# Altium footprint library MyPcbLib.PcbLib: 657 footprints (part 4 of 42)
Each footprint in its own frame and in the unit in brackets; x right, y up, seen from the top. Pads: shape width x height; smd on the part's side, far side on the other; paste and mask are expansions set on the pad; w line width, h text height; cw(c..) or ccw(c..) is an arc to the next point about the centre after c.
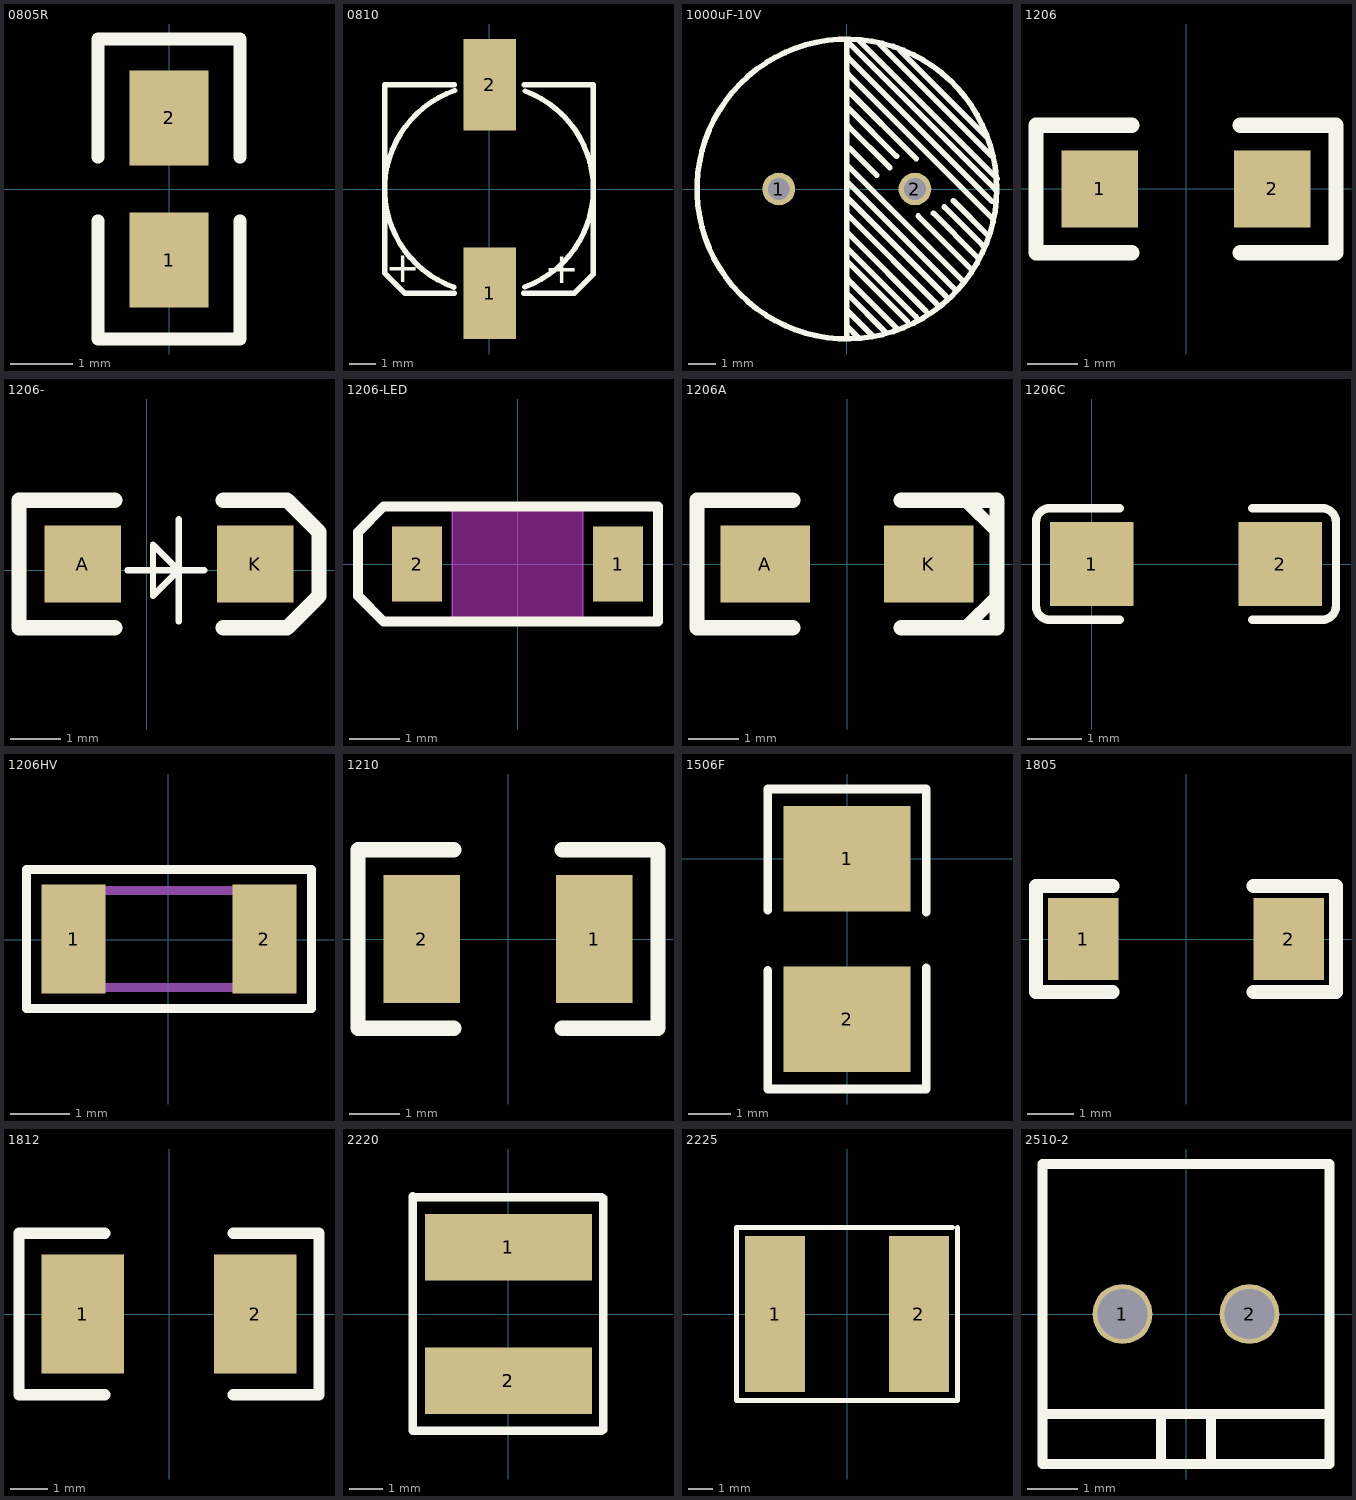
[diagram p3: the footprints below, top view; thin cyan lines are the x and y axes]

## 0805R [mil]
height 9.5
pads (2):
  rect 50x60 smd: 1(0,-45) 2(0,45)
Top Overlay:
  lines w8: -45,-20 -45,-95 45,-95 45,-20 ; -45,20 -45,95 45,95 45,20
3D body: height 29.53, standoff 0, extent -27.57,-45.27 25.58,45.28

## 0810 [mm] "220uF/35V"
pads (2):
  rect 2x3.5 smd: 1(0.025,-4) 2(0.025,4)
Top Overlay:
  lines w0.203: -1.355,-3.764 cw(c0,0) -1.317,3.777 ; -1.321,-4 -3.214,-4 -4,-3.214 -4,4 -1.321,4 ; 1.321,-4 3.264,-4 4,-3.264 4,4 1.346,4 ; 1.371,-3.758 ccw(c0,0) 1.377,3.756
  text "+" at 3.454,-3.988 h2
  text "+" at -2.642,-3.962 h2

## 1000uF-10V [mm]
pads (2):
  round 1.2 hole 0.8: 1(-2.5,0) 2(2.5,0)
Top Overlay:
  circle w0.203: c0,0 r5.5
  lines w0.203: 0,-5.5 0,5.5 ; 0,-2.642 2.21,-4.851 ; 0,-2.159 2.54,-4.699 ; 0,0.279 3.988,-3.708 ; 0,0.889 4.216,-3.327 ; 0.025,-5.055 0.432,-5.461 ; 0.025,-3.861 1.422,-5.258 ; 0.025,-3.302 1.803,-5.08 ; 0.025,-0.94 3.353,-4.267 ; 0.025,2.337 1.575,0.787 ; 0.025,4.242 5.309,-1.041 ; 0.025,4.851 5.334,-0.457 ; 0.025,5.41 5.436,0 ; 0.051,-4.496 0.914,-5.359 ; 0.051,-0.356 3.632,-3.937 ; 0.051,2.972 1.829,1.194 ; 0.051,3.607 2.54,1.118 ; 0.076,-1.651 2.896,-4.47 ; 0.102,1.499 1.092,0.508 ; 0.457,5.436 5.512,0.381 ; 1.168,5.359 5.309,1.219 ; 1.956,5.08 5.156,1.88 ; 2.616,-0.991 4.547,-2.921 ; 3.175,-0.889 4.775,-2.489 ; 3.581,-0.66 4.978,-2.057 ; 3.912,-0.432 5.207,-1.727

## 1206 [mil]
pads (2):
  rect 60x60 smd: 1(-67.5,0) 2(67.5,0)
Top Overlay:
  lines w12: -42.5,-50 -117.5,-50 -117.5,50 -42.5,50 ; 42.5,-50 117.5,-50 117.5,50 42.5,50
3D body: height 23.62, standoff 0, extent -61.98,-31 64,31.99

## 1206- [mil]
pads (2):
  rect 60x60 smd: A(-50,5) K(85,5)
Top Overlay:
  lines w5: -15,0 45,0 25,0 ; 25,-40 25,40 ; 25,0 5,-20 5,20 25,0
  lines w12: -25,-45 -100,-45 -100,55 -25,55 ; 60,-45 110,-45 135,-20 135,30 110,55 60,55
3D body: height 23.62, standoff 0, extent -42.99,-25 82.99,37.99

## 1206-LED [mm]
pads (2):
  rect 1x1.5 smd: 1(2,0) 2(-2,0)
Top Overlay:
  lines w0.203: -3.175,-0.635 -2.667,-1.143 2.794,-1.143 2.794,1.143 -2.667,1.143 -3.175,0.635 -3.175,-0.635
Keep-Out Layer:
  board cut-out: 1.295,1.194 -1.295,1.194 -1.295,-1.194 1.295,-1.194
Mechanical 1:
  lines w0.025: -1.3,-1.2 -1.3,1.2 1.3,1.2 1.3,-1.2 -1.3,-1.2
3D body: height 0.62, standoff -0.15, extent -1.6,-0.789 1.6,0.711

## 1206A [mil]
pads (2):
  rect 70x60 smd: A(-64,0) K(64,0)
Top Overlay:
  lines w10: 92.5,-50 117.5,-25 ; 92.5,50 117.5,25
  lines w12: -42.5,-50 -117.5,-50 -117.5,50 -42.5,50 ; 42.5,-50 117.5,-50 117.5,50 42.5,50
3D body: height 53.15, standoff 0, extent -75.84,-26.51 69.84,34.5

## 1206C [mil]
height 9.5
pads (2):
  rect 60x60 smd: 1(0,0) 2(135,0)
Top Overlay:
  lines w6: 20,-40 -30,-40 cw(c-30,-30) -40,-30 -40,30 cw(c-30,30) -30,40 20,40 ; 115,-40 165,-40 ccw(c165,-30) 175,-30 175,30 ccw(c165,30) 165,40 115,40

## 1206HV [mil]
pads (2):
  rect 42x72 smd: 1(-62.55,0.61) 2(63.45,0.61)
Top Overlay:
  lines w6: -93.55,-45.39 94.45,-45.39 94.45,46.61 -93.55,46.61 -93.55,-45.39
Mechanical 1:
  lines w6: -62.55,-31.39 63.45,-31.39 63.45,32.61 -62.55,32.61 -62.55,-31.39

## 1210 [mil]
pads (2):
  rect 60x100 smd: 1(67.5,0) 2(-67.5,0)
Top Overlay:
  lines w12: -42.5,-70 -117.5,-70 -117.5,70 -42.5,70 ; 42.5,-70 117.5,-70 117.5,70 42.5,70

## 1506F [mm]
height 0.241
pads (2):
  rect 3x2.5 smd: 1(0,0) 2(0,-3.81)
Top Overlay:
  lines w0.203: -1.88,-2.642 -1.88,-5.461 1.88,-5.461 1.88,-2.591 ; -1.88,-1.219 -1.88,1.651 1.88,1.651 1.88,-1.27

## 1805 [mil]
pads (2):
  rect 60x70 smd: 1(-87.5,0) 2(87.5,0)
Top Overlay:
  lines w12: -62.5,-45 -127.5,-45 -127.5,45 -62.5,45 ; 57.5,-45 127.5,-45 127.5,45 57.5,45

## 1812 [mm]
pads (2):
  rect 2.2x3.175 smd: 1(-2.3,0) 2(2.3,0)
Top Overlay:
  lines w0.305: -1.714,-2.159 -4,-2.159 -4,2.159 -1.714,2.159 ; 1.714,-2.159 4,-2.159 4,2.159 1.714,2.159

## 2220 [mm]
pads (2):
  rect 5x2 smd: 1(0,2) 2(0,-2)
Top Overlay:
  lines w0.254: -2.87,-3.505 -2.87,3.531 ; -2.8,-3.5 2.8,-3.5 ; -2.8,3.5 2.8,3.5 ; 2.845,-3.48 2.845,3.48

## 2225 [mm]
pads (2):
  rect 2.5x6.5 smd: 1(-3,0) 2(3,0)
Top Overlay:
  lines w0.203: 4.4,3.6 -4.6,3.6 -4.6,-3.6 4.6,-3.6 4.6,3.6

## 2510-2 [mm]
pads (2):
  round 1.2 hole 1: 1(-1.27,0) 2(1.27,0)
Top Overlay:
  lines w0.203: -2.87,-2 2.87,-2 ; -0.5,-2.949 -0.5,-2 ; 0.5,-3 0.5,-2 ; -2.87,-3 2.87,-3 2.87,3 -2.87,3 -2.87,-3
3D body: height 11.7, standoff -2, extent -2.54,-3 2.54,2.8